# Altium footprint library THU VIEN PCB.PCBLib: 534 footprints (part 17 of 34)
Each footprint in its own frame and in the unit in brackets; x right, y up, seen from the top. Pads: shape width x height; smd on the part's side, far side on the other; paste and mask are expansions set on the pad; w line width, h text height; cw(c..) or ccw(c..) is an arc to the next point about the centre after c.
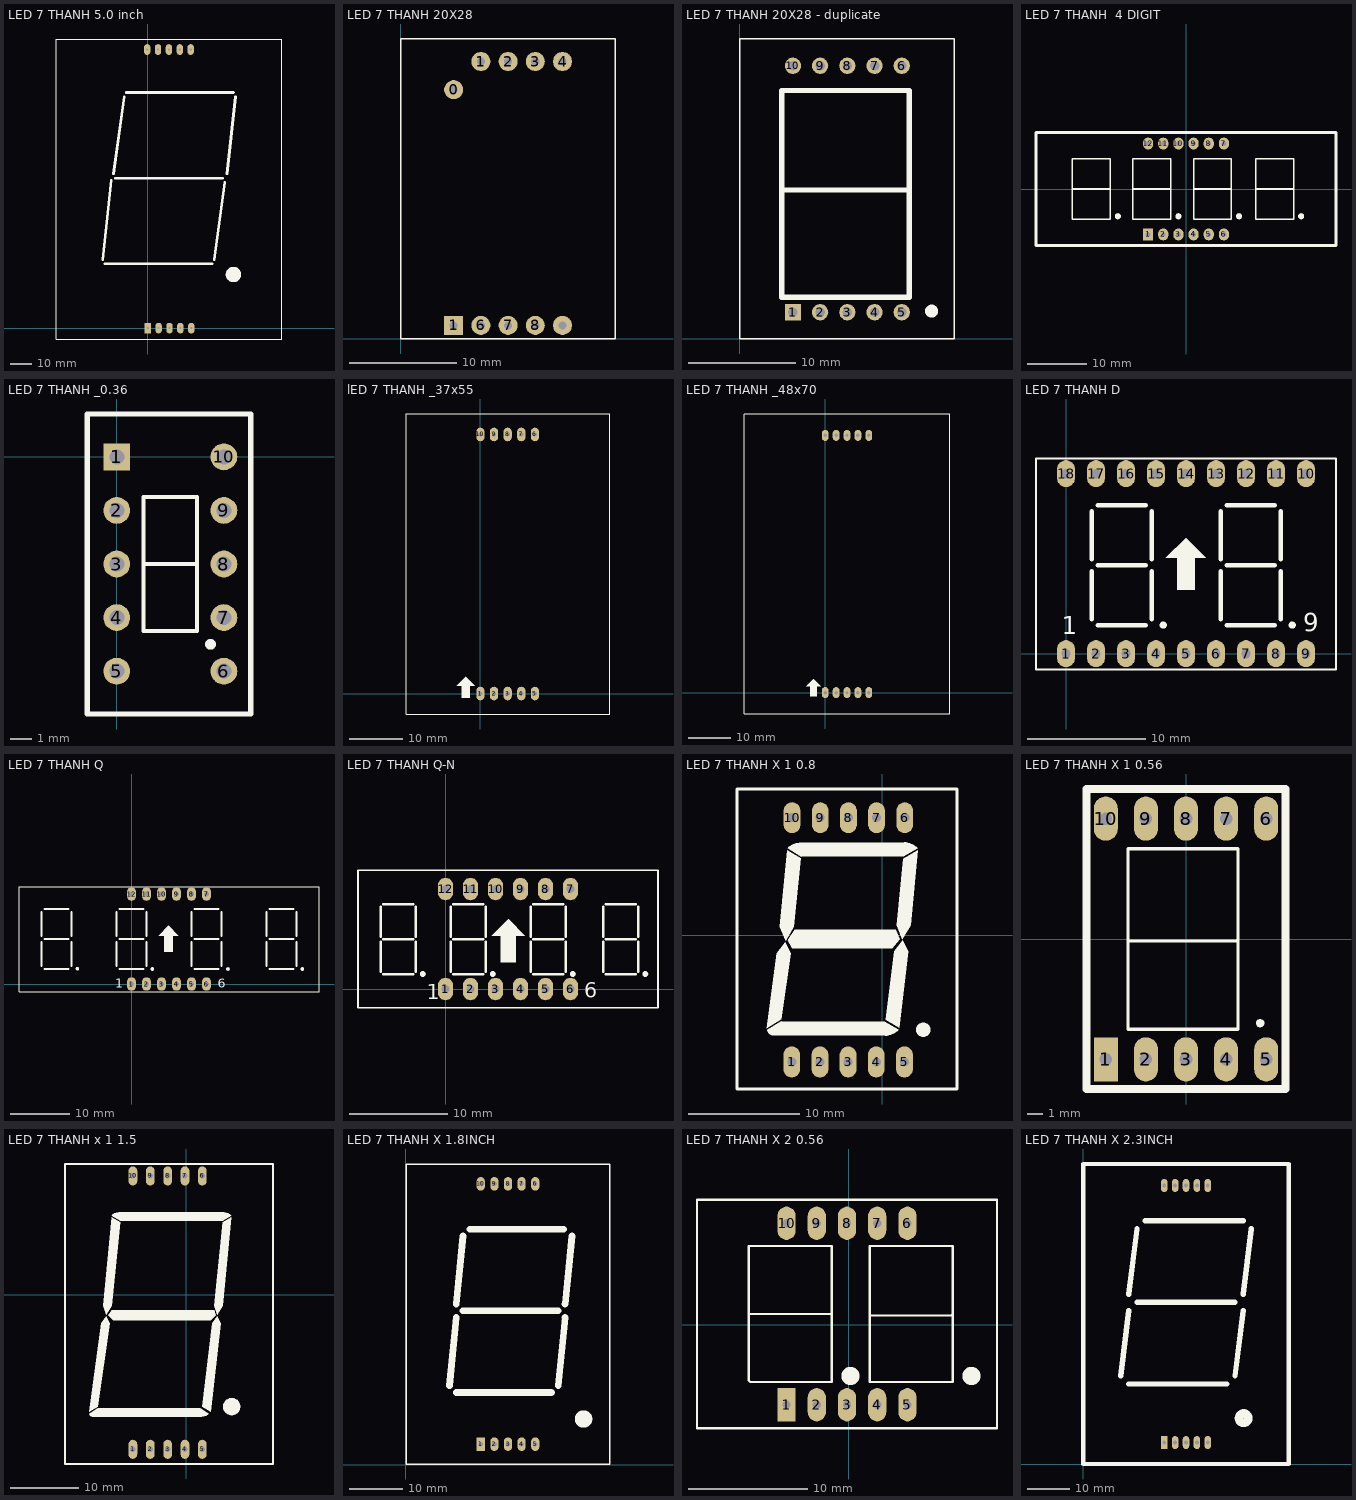
[diagram p16: the footprints below, top view; thin cyan lines are the x and y axes]

## LED 7 THANH 5.0 inch [mm]
pads (10):
  rect 3x5 hole 1: 1(0,0)
  oval 3x5 hole 1: 2(5.08,0) 3(10.16,0) 4(15.24,0) 5(20.32,0) 6(20.06,130) 7(14.98,130) 8(9.9,130) 9(4.82,130) 10(-0.26,130)
Top Overlay:
  circle w4: c40,25 r1.581
  lines w0.508: -42.56,-5.08 62.44,-5.08 62.44,134.92 -42.56,134.92 -42.56,-5.08
  lines w1.27: -21,32 -17,69 ; -20,30 30,30 ; -16,72 -11,108 ; -15,70 35,70 ; -10,110 40,110 ; 31,32 36,68 ; 37,72 41,108

## LED 7 THANH 20X28 [mil]
pads (10):
  round 70 hole 30: 0(194,916.14) 1(294,1019.68) 2(394,1019.68) 3(494,1019.68) 4(594,1019.68) 6(294,50) 7(394,50) 8(494,50) ""(594,50)
  rect 70x70 hole 30: 1(194,50)
Top Overlay:
  lines w5: 0,0 787.4,0 787.4,1102.36 0,1102.36 0,787.4 0,0

## LED 7 THANH 20X28 - duplicate [mil]
pads (10):
  rect 60x60 hole 35: 1(195,98.43)
  round 60 hole 35: 2(295,98.43) 3(395,98.43) 4(495,98.43) 5(595,98.43) 6(595,1003.94) 7(495,1003.94) 8(395,1003.94) 9(295,1003.94) 10(195,1003.94)
Top Overlay:
  circle w39.37: c704.72,102.36 r3.94
  lines w5: 0,0 787.4,0 787.4,1102.36 0,1102.36 0,787.4 0,0
  lines w19.68: 153.54,547.24 622.05,547.24 ; 153.54,153.54 622.05,153.54 622.05,913.39 153.54,913.39 153.54,153.54

## LED 7 THANH  4 DIGIT [mm] "LED 7SEG 4DIGIT"
height 7.62
pads (12):
  rect 1.7x2 hole 0.8: 1(-6.35,-7.62)
  oval 1.7x2 hole 0.8: 2(-3.81,-7.62) 3(-1.27,-7.62) 4(1.27,-7.62) 5(3.81,-7.62) 6(6.35,-7.62) 7(6.35,7.62) 8(3.81,7.62) 9(1.27,7.62) 10(-1.27,7.62) 11(-3.81,7.62) 12(-6.35,7.62)
Top Overlay:
  circle w0.508: c-11.43,-4.572 r0.254
  circle w0.508: c-1.27,-4.572 r0.254
  circle w0.508: c8.89,-4.572 r0.254
  circle w0.508: c19.304,-4.572 r0.254
  lines w0.254: -19.05,0 -12.7,0 ; -8.89,0 -2.54,0 ; 1.27,0 7.62,0 ; 11.684,0 18.034,0 ; -19.05,-5.08 -12.7,-5.08 -12.7,5.08 -19.05,5.08 -19.05,-5.08 ; -8.89,-5.08 -8.89,5.08 -2.54,5.08 -2.54,-5.08 -8.89,-5.08 ; 1.27,-5.08 1.27,5.08 7.62,5.08 7.62,-5.08 1.27,-5.08 ; 11.684,-5.08 11.684,5.08 18.034,5.08 18.034,-5.08 11.684,-5.08
  lines w0.5: -25.15,-9.5 -25.15,9.5 25.15,9.5 25.15,-9.5 -25.15,-9.5
3D body "User Library-C-564 (7 segment 4 digit LED display).step": height 8.01, standoff -6.19, extent -25.2,-9.475 25.2,9.525

## LED 7 THANH _0.36 [mil] "led 7 - 0.36 - 10 pin"
height 314.96
pads (10):
  rect 50x50 hole 28: 1(0,0)
  round 50 hole 28: 2(0,-100) 3(0,-200) 4(0,-300) 5(0,-400) 6(200,-400) 7(200,-300) 8(200,-200) 9(200,-100) 10(200,0)
Top Overlay:
  circle w10: c175,-350 r5
  lines w7.87: 55,-200 150,-200 ; 50,-325 50,-75 150,-75 150,-325 50,-325
  lines w10: -55,-480 -55,80 250,80 250,-480 -55,-480
3D body "SW3dPS-Disp_SA36-11.STEP": height 335.15, standoff -156.98, extent -50.27,-475.59 245,75.59

## lED 7 THANH _37x55 [mil] "DIP 10 Leads; Body 29 x 41 mm; Pitch 0.5 mm"
height 300
pads (10):
  oval 60x100 hole 32: 1(0,0) 2(100,0) 3(200,0) 4(300,0) 5(400,0) 6(400,1900) 7(300,1900) 8(200,1900) 9(100,1900) 10(0,1900)
Top Overlay:
  region: -174,56 -108,122 -106,122 -41,57 -41,56 -78,56 -78,-32 -137,-32 -137,56
  lines w7: -545,-150 950,-150 950,2050 -545,2050 -545,-150

## LED 7 THANH _48x70 [mm] "DIP 10 Leads; Body 47,76 x 70mm; Pitch 0.5 mm"
height 7.62
pads (10):
  oval 1.6x2.54 hole 0.813: 1(0,0) 2(2.54,0) 3(5.08,0) 4(7.62,0) 5(10.16,0) 6(10.16,60) 7(7.62,60) 8(5.08,60) 9(2.54,60) 10(0,60)
Top Overlay:
  region: -4.42,1.422 -2.743,3.099 -2.692,3.099 -1.041,1.448 -1.041,1.422 -1.981,1.422 -1.981,-0.813 -3.48,-0.813 -3.48,1.422
  lines w0.178: -18.92,65 29.08,65 ; -18.92,-5 29.08,-5 -18.92,-5
  lines w0.203: -18.923,-4.928 -18.923,64.999 ; 29.058,-4.928 29.058,64.999

## LED 7 THANH D [mil] "DIP 18 Leads; Body 24 x 15 mm; Pitch 0.5 mm"
height 300
pads (18):
  oval 60x90 hole 31 paste-99999: 1(0,0) 2(100,0) 3(200,0) 5(400,0) 6(500,0) 7(600,0) 8(700,0) 9(800,0) 10(800,600) 11(700,600) 12(600,600) 13(500,600) 14(400,600) 15(300,600) 16(200,600) 17(100,600) 18(0,600)
  oval 60x90 hole 31: 4(300,0)
Top Overlay:
  circle w12: c754,95 r6
  circle w12: c324,95 r6
  region: 333,319 399,385 401,385 466,320 466,319 429,319 429,213 370,213 370,319
  lines w7: -100,-52.5 -100,650 ; -100,-52.5 -100,650 ; -100,-52.5 -100,650 ; -100,-52.5 -100,650 ; -100,650 900,650 ; -100,650 900,650 ; -100,650 900,650 ; -100,650 900,650 ; 900,-52.5 -100,-52 900,-52.5 ; 900,-52.5 900,650 ; 900,-52.5 900,650 ; 900,-52.5 900,650 ; 900,-52.5 900,650
  lines w15: 85,115 85,275 ; 85,115 85,275 ; 85,115 85,275 ; 85,115 85,275 ; 85,115 85,275 ; 85,115 85,275 ; 85,115 85,275 ; 85,115 85,275 ; 85,315 85,475 ; 85,315 85,475 ; 85,315 85,475 ; 85,315 85,475 ; 85,315 85,475 ; 85,315 85,475 ; 85,315 85,475 ; 85,315 85,475 ; 105,95 265,95 ; 105,95 265,95 ; 105,95 265,95 ; 105,95 265,95 ; 105,295 265,295 ; 105,295 265,295 ; 105,295 265,295 ; 105,295 265,295 ; 105,295 265,295 ; 105,295 265,295 ; 105,295 265,295 ; 105,295 265,295 ; 105,495 265,495 ; 105,495 265,495 ; 105,495 265,495 ; 105,495 265,495 ; 285,115 285,275 ; 285,115 285,275 ; 285,115 285,275 ; 285,115 285,275 ; 285,115 285,275 ; 285,115 285,275 ; 285,115 285,275 ; 285,115 285,275 ; 285,315 285,475 ; 285,315 285,475 ; 285,315 285,475 ; 285,315 285,475 ; 285,315 285,475 ; 285,315 285,475 ; 285,315 285,475 ; 285,315 285,475 ; 515,115 515,275 ; 515,115 515,275 ; 515,115 515,275 ; 515,115 515,275 ; 515,115 515,275 ; 515,115 515,275 ; 515,115 515,275 ; 515,115 515,275 ; 515,315 515,475 ; 515,315 515,475 ; 515,315 515,475 ; 515,315 515,475 ; 515,315 515,475 ; 515,315 515,475 ; 515,315 515,475 ; 515,315 515,475 ; 535,95 695,95 ; 535,95 695,95 ; 535,95 695,95 ; 535,95 695,95 ; 535,295 695,295 ; 535,295 695,295 ; 535,295 695,295 ; 535,295 695,295 ; 535,295 695,295 ; 535,295 695,295 ; 535,295 695,295 ; 535,295 695,295 ; 535,495 695,495 ; 535,495 695,495 ; 535,495 695,495 ; 535,495 695,495 ; 715,115 715,275 ; 715,115 715,275 ; 715,115 715,275 ; 715,115 715,275 ; 715,115 715,275 ; 715,115 715,275 ; 715,115 715,275 ; 715,115 715,275 ; 715,315 715,475 ; 715,315 715,475 ; 715,315 715,475 ; 715,315 715,475 ; 715,315 715,475 ; 715,315 715,475 ; 715,315 715,475 ; 715,315 715,475
  text "1" at -14,65 h60
  text "9" at 790,75 h60

## LED 7 THANH Q [mil] "DIP 12 Leads; Body 48 x 20 mm; Pitch 0.5 mm"
height 300
pads (12):
  oval 60x90 hole 31: 1(0,0) 2(100,0) 3(200,0) 4(300,0) 5(400,0) 6(500,0) 7(500,600) 8(400,600) 9(300,600) 10(200,600) 11(100,600) 12(0,600)
Top Overlay:
  drawing of 155 lines, arcs and shapes, not listed
  text "6" at 575,-26 h60
  text "1" at -108,-24 h60

## LED 7 THANH Q-N [mil] "DIP 12 Leads; Body 32x 15 mm; Pitch 0.5 mm"
height 300
pads (12):
  oval 60x90 hole 31: 1(0,0) 2(100,0) 3(200,0) 4(300,0) 5(400,0) 6(500,0) 7(500,400) 8(400,400) 9(300,400) 10(200,400) 11(100,400) 12(0,400)
Top Overlay:
  circle w12: c189,60 r6
  circle w12: c-91,60 r6
  circle w12: c799,60 r6
  circle w12: c509,60 r6
  region: 184,213 250,279 252,279 317,214 317,213 280,213 280,107 221,107 221,213
  lines w7: -350,-75 850,-75 850,475 -350,475 -350,-75
  lines w10: -260,70 -260,190 ; -260,210 -260,330 ; -250,60 -130,60 ; -250,340 -130,340 ; -120,70 -120,190 ; -120,210 -120,330 ; 20,70 20,190 ; 20,210 20,330 ; 30,60 150,60 ; 30,340 150,340 ; 160,70 160,190 ; 160,210 160,330 ; 340,70 340,190 ; 340,210 340,330 ; 350,60 470,60 ; 350,340 470,340 ; 480,70 480,190 ; 480,210 480,330 ; 630,70 630,190 ; 630,210 630,330 ; 640,60 760,60 ; 640,340 760,340 ; 770,70 770,190 ; 770,210 770,330 ; -250,200 -130,200 -250,200 ; 30,200 150,200 30,200 ; 350,200 470,200 350,200 ; 640,200 760,200 640,200
  text "6" at 555,-35 h60
  text "1" at -75,-40 h60
3D body "User Library-7-seg-4_asm.STEP": height 284.07, standoff -235.62, extent -336.1,-80.59 845,470.59

## LED 7 THANH X 1 0.8 [mil]
pads (10):
  oval 60x110 hole 32: 1(-321,-449) 2(-221,-449) 3(-121,-449) 4(-21,-449) 5(79,-449) 6(80,418) 7(-20,418) 8(-120,418) 9(-220,418) 10(-320,418)
Top Overlay:
  region: -335.74,309.85 -331.06,314.53 -320.05,321.89 -307.82,326.96 -294.83,329.54 -288.21,329.54 78.21,330.14 84.83,330.14 97.82,327.55 110.05,322.49 121.06,315.13 125.74,310.45 76.04,280.63 -286.53,280.33
  region: -344.34,-23.18 -373.86,-62.55 -409.71,-328.82 -358.28,-297.97 -324.65,-62.55
  region: 72.06,-17.42 91.75,-56.79 60.53,-327.32 12.91,-298.75 42.54,-56.79
  region: 58.37,-335.45 53.69,-340.13 42.68,-347.48 30.45,-352.55 17.47,-355.13 10.85,-355.13 -387.94,-353.74 -391.86,-353.74 -399.09,-350.74 -404.63,-345.21 -407.63,-337.97 -407.63,-334.06 -358.41,-304.53 8.41,-305.47
  region: -335,-17.5 -310.22,19.67 48.21,20.27 63.05,-13.11 35.71,-45 -319.29,-45
  region: -336.82,302.09 -288.94,273.37 -313.68,30.97 -343.2,-18.24 -362.89,30.97
  region: 126.19,302.71 75.43,272.26 51.36,36.32 71.04,-12.9 100.57,36.32
  region: 170.48,-335.12 170.48,-340.1 166.67,-349.28 159.64,-356.32 150.45,-360.12 145.48,-360.12 140.51,-360.12 131.32,-356.32 124.29,-349.28 120.48,-340.1 120.48,-335.12 120.48,-330.15 124.29,-320.96 131.32,-313.93 140.51,-310.12 145.48,-310.12 150.45,-310.12 159.64,-313.93 166.67,-320.96 170.48,-330.15
  lines w10: -515,-545 265,-545 265,520 -515,520 -515,-545

## LED 7 THANH X 1 0.56 [mil] "LED 7SEG 1DIGIT"
height 300
pads (10):
  rect 60x110 hole 31.5: 1(-200,-300)
  oval 60x110 hole 31.5: 2(-100,-300) 3(0,-300) 4(100,-300) 5(200,-300) 6(200,300) 7(100,300) 8(0,300) 9(-100,300) 10(-200,300)
Top Overlay:
  region: 195,-210 195,-211.99 193.48,-215.66 190.66,-218.48 186.99,-220 185,-220 183.01,-220 179.34,-218.48 176.52,-215.66 175,-211.99 175,-210 175,-208.01 176.52,-204.34 179.34,-201.52 183.01,-200 185,-200 186.99,-200 190.66,-201.52 193.48,-204.34 195,-208.01
  lines w7.87: -140,-5 125,-5 130,0 ; -145,-225 130,-225 130,225 -145,225 -145,-225
  lines w19.68: -248.03,-374.02 -248.03,374.02 248.03,374.02 248.03,-374.02 -248.03,-374.02
3D body "LED 7SEG x 1 0.56.STEP": height 315.56, standoff -156.88, extent -249.99,-374.99 250.01,375

## LED 7 THANH x 1 1.5 [mil]
pads (10):
  oval 50x110 hole 32: 1(-308,-890) 2(-208,-890) 3(-108,-890) 4(-8,-890) 5(92,-890) 6(92,686) 7(-8,686) 8(-108,686) 9(-208,686) 10(-308,686)
Top Overlay:
  region: -430.9,457.84 -426.22,462.52 -415.21,469.88 -402.98,474.94 -389.99,477.53 -383.37,477.53 210.55,477.53 217.17,477.53 230.16,474.94 242.39,469.88 253.4,462.52 258.08,457.84 208.87,428.31 -381.69,428.31
  region: -460.43,-122.87 -489.95,-162.24 -558.85,-674.05 -509.64,-644.52 -440.74,-162.24
  region: 179.34,-122.87 199.02,-162.24 139.97,-674.05 90.76,-644.52 149.81,-162.24
  region: 130.13,-683.89 125.45,-688.57 114.44,-695.93 102.21,-700.99 89.22,-703.57 82.6,-703.57 -539.17,-703.57 -543.08,-703.57 -550.32,-700.58 -555.85,-695.04 -558.85,-687.81 -558.85,-683.89 -509.64,-654.36 80.91,-654.36
  region: -450.58,-117.94 -430.9,-88.42 159.65,-88.42 169.5,-117.94 139.97,-147.47 -421.06,-147.47
  region: -430.9,448 -381.69,418.47 -430.9,-63.81 -460.43,-113.02 -480.11,-63.81
  region: 258.08,448 208.87,418.47 159.65,-63.81 179.34,-113.02 208.87,-63.81
  region: 261.5,-594.89 266.34,-594.89 275.85,-596.78 284.81,-600.49 292.87,-605.87 299.72,-612.73 305.11,-620.79 308.82,-629.74 310.71,-639.25 310.71,-644.1 310.71,-648.95 308.82,-658.45 305.11,-667.41 299.72,-675.47 292.87,-682.32 284.81,-687.71 275.85,-691.42 266.34,-693.31 261.5,-693.31 256.65,-693.31 247.14,-691.42 238.19,-687.71 230.13,-682.32 223.27,-675.47 217.89,-667.41 214.18,-658.45 212.29,-648.95 212.29,-644.1 212.29,-639.25 214.18,-629.74 217.89,-620.79 223.27,-612.73 230.13,-605.87 238.19,-600.49 247.14,-596.78 256.65,-594.89
  lines w10: -700,-975 -700,755 500,755 500,-975 -700,-975
3D body "LED 7SEG x1 1.5 Anot.STEP": height 492.73, standoff -156.88, extent -760.12,-1025 545,825.39

## LED 7 THANH X 1.8INCH [mil]
pads (10):
  rect 60x100 hole 35.43: 1(553,151)
  oval 60x100 hole 35.43: 2(653,151) 3(753,151) 4(853,151) 5(953,151) 6(953,2064.39) 7(853,2064.39) 8(753,2064.39) 9(653,2064.39) 10(553,2064.39)
Top Overlay:
  circle w78.74: c1308.12,336.04 r24.9
  lines w10: 4.97,5.33 4.97,2210.06 1501.03,2210.06 1501.03,5.33 4.97,5.33
  lines w50: 323,581 373,1081 ; 373,531 1073,531 ; 373,1181 423,1681 ; 423,1131 1123,1131 ; 473,1731 1163,1731 ; 1123,581 1173,1081 ; 1173,1181 1223,1681
3D body "User Library-King Bright SX18-11.STEP": height 435, standoff -155.55, extent 2.94,6.33 1499,2211.06

## LED 7 THANH X 2 0.56 [mil]
pads (10):
  rect 60x110 hole 27.56: 1(-205,-265)
  oval 60x110 hole 27.56: 2(-105,-265) 3(-5,-265) 4(95,-265) 5(195,-265) 6(195,335) 7(95,335) 8(-5,335) 9(-105,335) 10(-205,335)
Top Overlay:
  circle w40: c406.4,-170 r10
  circle w40: c6.4,-170 r10
  lines w7.87: -330,35 -55,35 ; 75,30 340,30 345,35 ; -501.06,-342.95 -501.06,412.95 491.06,412.95 491.06,-342.95 -501.06,-342.95 ; -330,-185 -325,-190 -55,-190 -55,260 -330,260 -330,-185 ; 70,-190 345,-190 345,260 70,260 70,-190
3D body "LED 7SEG x2 0.56.STEP": height 315.56, standoff -156.88, extent -492.12,-339.99 492.13,410.01

## LED 7 THANH X 2.3INCH [mm]
pads (10):
  rect 1.524x3.048 hole 0.9: 1(18.92,5)
  oval 1.524x3.048 hole 0.9: 2(21.46,5) 3(24,5) 4(26.54,5) 5(29.08,5) 6(29.08,65) 7(26.56,65) 8(24,65) 9(21.46,65) 10(18.92,65)
Top Overlay:
  circle w2: c37.455,10.701 r1.082
  lines w1: 40.6,0 0,0 ; 40.8,70 0,70 ; 0,0 48,0 48,70 0,70 ; 0,0 0,70 ; 0,0 0,70
  lines w1.27: 8.763,20.574 10.668,35.814 ; 10.668,18.669 33.528,18.669 ; 10.668,39.624 12.573,54.864 ; 12.573,37.719 35.433,37.719 ; 14.478,56.769 37.338,56.769 ; 35.433,20.574 37.338,35.814 ; 37.338,39.624 39.243,54.864
3D body "User Library-King Bright SA23-11.STEP": height 11.94, standoff -4.06, extent -0.022,0.025 47.978,70.025